# Altium footprint library Miscellaneous Devices LC.PcbLib: 776 footprints (part 14 of 49)
Each footprint in its own frame and in the unit in brackets; x right, y up, seen from the top. Pads: shape width x height; smd on the part's side, far side on the other; paste and mask are expansions set on the pad; w line width, h text height; cw(c..) or ccw(c..) is an arc to the next point about the centre after c.
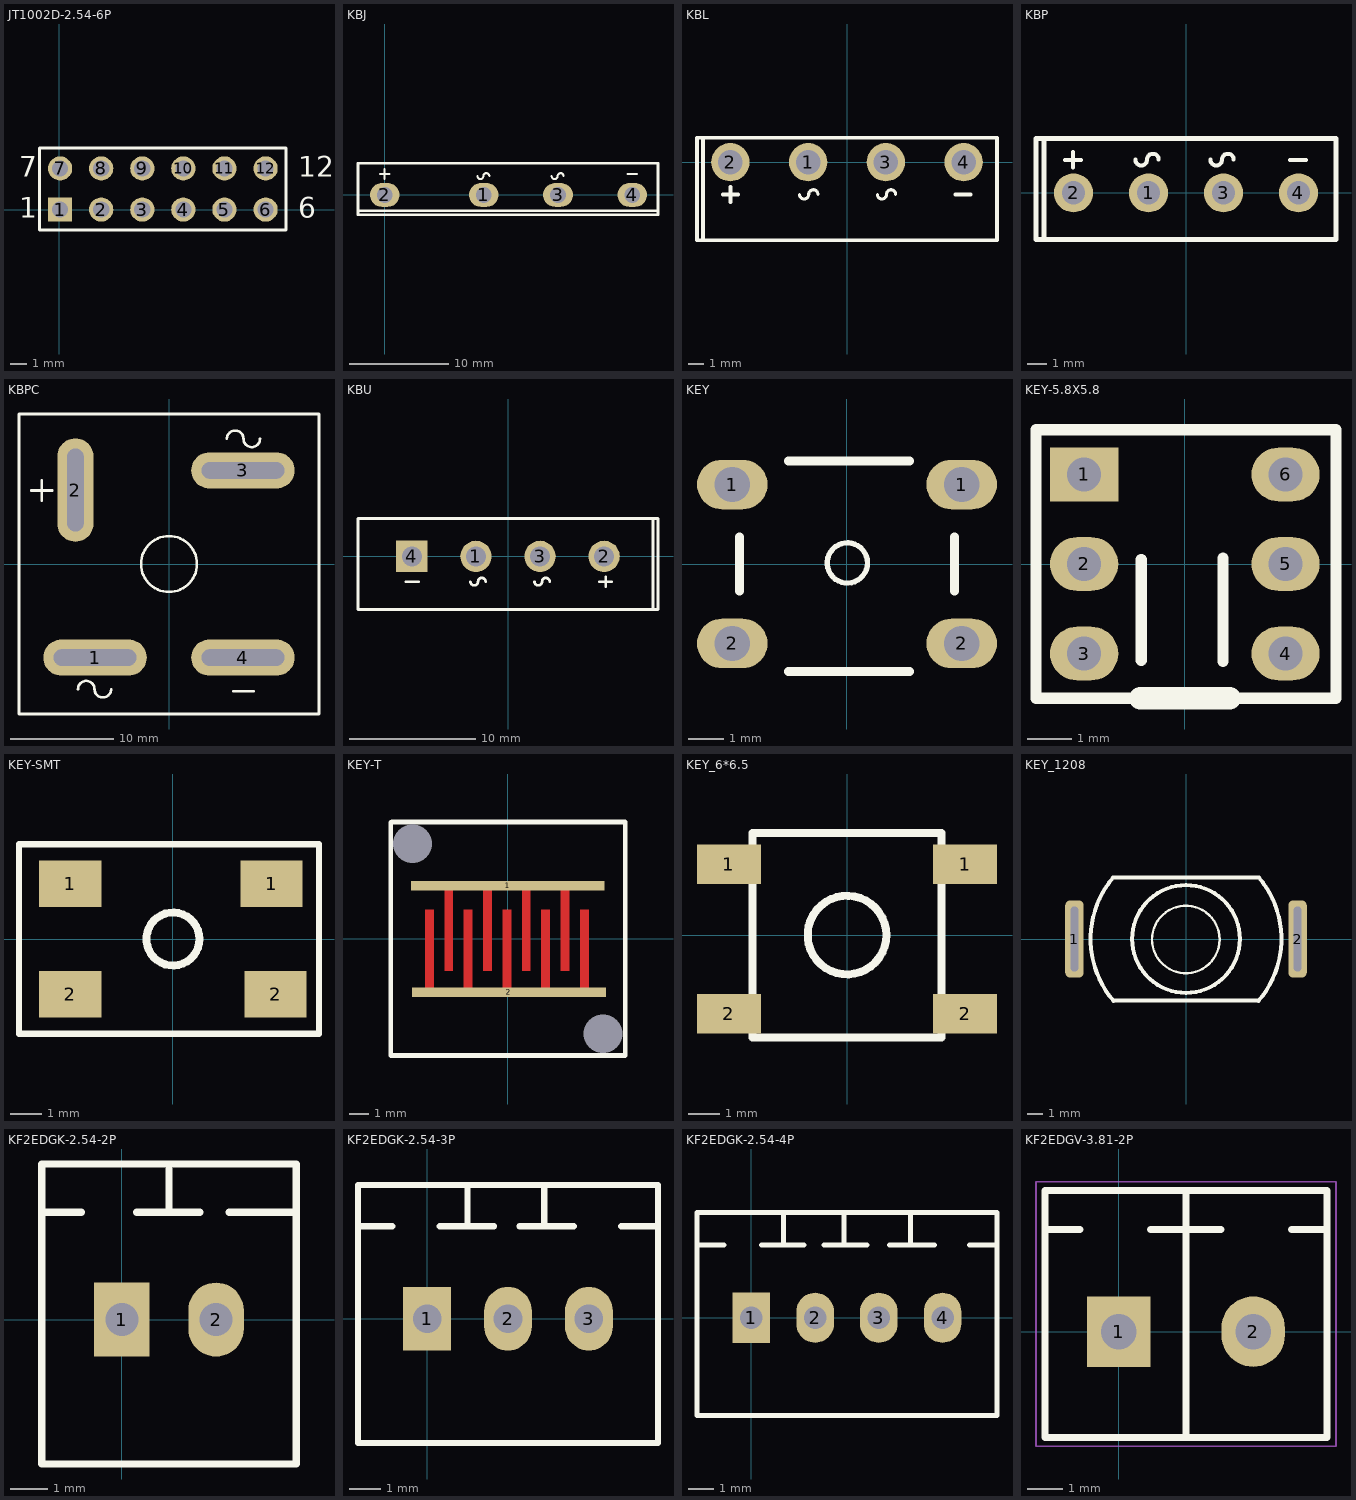
[diagram p13: the footprints below, top view; thin cyan lines are the x and y axes]

## JT1002D-2.54-6P [mm]
pads (12):
  rect 1.5x1.5 hole 1: 1(0.04,0)
  round 1.5 hole 1: 2(2.58,0) 3(5.12,0) 4(7.66,0) 5(10.2,0) 6(12.74,0) 7(0.04,2.54) 8(2.58,2.54) 9(5.12,2.54) 10(7.66,2.54) 11(10.2,2.54) 12(12.74,2.54)
Top Overlay:
  lines w0.2: -1.23,-1.27 14.01,-1.27 14.01,3.81 -1.23,3.81 -1.23,-1.27
  text "12" at 14.772,2.032 h1.27
  text "6" at 14.772,-0.508 h1.27
  text "1" at -2.5,-0.508 h1.27
  text "7" at -2.5,2.032 h1.27

## KBJ [mm]
pads (4):
  oval 3x2.4 hole 1.6: 1(10,0) 2(0,0) 3(17.5,0) 4(25,0)
Top Overlay:
  lines w0.203: -0.5,2.1 0.5,2.1 ; 0,1.6 0,2.6 ; 9.36,1.9 ccw(c9.66,1.9) 9.96,1.9 cw(c10.26,1.9) 10.56,1.9 ; 16.86,1.9 ccw(c17.16,1.9) 17.46,1.9 cw(c17.76,1.9) 18.06,1.9 ; 24.5,2.1 25.5,2.1
  lines w0.254: -2.7,-1.6 27.6,-1.6 ; -2.7,-2 27.6,-2 27.6,3.2 -2.7,3.2 -2.7,-2

## KBL [mm]
pads (4):
  round 2.5 hole 1.6: 1(-2.54,0) 2(-7.62,0) 3(2.54,0) 4(7.62,0)
Top Overlay:
  lines w0.203: -3.1,-2.1 ccw(c-2.8,-2.1) -2.5,-2.1 cw(c-2.2,-2.1) -1.9,-2.1 ; 1.98,-2.1 ccw(c2.28,-2.1) 2.58,-2.1 cw(c2.88,-2.1) 3.18,-2.1
  lines w0.254: -9.4,-5.1 -9.4,1.5 ; -8.12,-2.1 -7.12,-2.1 ; -7.62,-2.6 -7.62,-1.6 ; 7.08,-2.1 8.08,-2.1 ; -9.8,-5.1 9.8,-5.1 9.8,1.6 -9.8,1.6 -9.8,-5.1

## KBP [mm]
pads (4):
  round 2 hole 1.2: 1(-1.925,0) 2(-5.775,0) 3(1.925,0) 4(5.775,0)
Top Overlay:
  lines w0.203: -6.2,1.7 -5.4,1.7 ; -5.8,1.3 -5.8,2.1 ; -2.6,1.708 ccw(c-2.3,1.708) -2,1.708 cw(c-1.7,1.708) -1.4,1.708 ; 1.25,1.708 ccw(c1.55,1.708) 1.85,1.708 cw(c2.15,1.708) 2.45,1.708 ; 5.35,1.7 6.15,1.7
  lines w0.254: -7.3,-2.4 -7.3,2.8 ; -7.7,-2.4 7.7,-2.4 7.7,2.8 -7.7,2.8 -7.7,-2.4

## KBPC [mm]
pads (4):
  oval 10x3.5 hole 1.6 slot 8 at 0 deg: 1(-7.15,-9.05) 3(7.15,9.05) 4(7.15,-9.05)
  oval 3.5x10 hole 1.6 slot 8 at 90 deg: 2(-9.05,7.15)
Top Overlay:
  circle w0.254: c0,0 r2.7
  lines w0.254: -13.3,7.1 -11.3,7.1 ; -12.3,6.1 -12.3,8.1 ; -8.8,-12.1 cw(c-8,-12.1) -7.2,-12.1 ccw(c-6.4,-12.1) -5.6,-12.1 ; 5.6,12.1 cw(c6.4,12.1) 7.2,12.1 ccw(c8,12.1) 8.8,12.1 ; 6.2,-12.3 8.2,-12.3 ; -14.5,-14.5 -14.5,14.5 14.5,14.5 14.5,-14.5 -14.5,-14.5

## KBU [mm]
pads (4):
  round 2.5 hole 1.6: 1(-2.54,0) 2(7.62,0) 3(2.54,0)
  rect 2.5x2.5 hole 1.6: 4(-7.62,0)
Top Overlay:
  lines w0.203: -8.1,-2 -7.1,-2 ; -2.98,-2 ccw(c-2.68,-2) -2.38,-2 cw(c-2.08,-2) -1.78,-2 ; 2.1,-2 ccw(c2.4,-2) 2.7,-2 cw(c3,-2) 3.3,-2 ; 7.24,-2 8.24,-2 ; 7.74,-2.4 7.74,-1.6
  lines w0.254: 11.5,-4.2 11.5,3 ; -11.9,-4.2 11.9,-4.2 11.9,3 -11.9,3 -11.9,-4.2

## KEY [mm]
height 10
pads (4):
  oval 2x1.4 hole 1: 1(-3.25,2.25) 1(3.25,2.25) 2(-3.25,-2.25) 2(3.25,-2.25)
Top Overlay:
  circle w0.15: c0.01,0.03 r0.57
  lines w0.254: -3.048,-0.762 -3.048,0.762 ; -1.651,2.921 1.778,2.921 ; 3.048,-0.762 3.048,0.762 ; -1.651,-3.048 0.635,-3.048 1.778,-3.048 -1.651,-3.048

## KEY-5.8X5.8 [mm] "按键开关带自锁"
height 10
pads (6):
  rect 1.524x1.2 hole 0.762: 1(-2.25,2)
  oval 1.524x1.2 hole 0.762: 2(-2.25,0) 3(-2.25,-2) 4(2.25,-2) 5(2.25,0) 6(2.25,2)
Top Overlay:
  lines w0.254: -0.975,-2.15 -0.975,0.1 ; 0.85,-2.175 0.85,0.125 ; -3.325,-3 3.375,-3 3.375,3 -3.325,3 -3.325,-3
  lines w0.5: -1,-3 1,-3

## KEY-SMT [mm]
pads (4):
  rect 2x1.5 smd: 1(-3.302,1.778) 1(3.175,1.778) 2(-3.302,-1.778) 2(3.302,-1.778)
Top Overlay:
  circle w0.254: c0,0 r0.852
  lines w0.2: -4.953,-3.048 -4.953,3.048 4.699,3.048 4.699,-3.048 -4.953,-3.048
3D body "switch-tact-smt.STEP": height 1.5, standoff 0, extent -3.2,-2.667 3.2,2.633

## KEY-T [mm]
pads (4):
  rect 10x0.5 smd: 1(0.003,2.73) 2(0.063,-2.754)
  round 0 hole 2 unplated: " "(-4.912,4.9) " "(4.913,-4.9)
Top Layer:
  rectangle: 3.727,-2.959 4.184,1.511
  rectangle: 2.727,-1.664 3.184,2.807
  rectangle: 1.727,-2.959 2.184,1.511
  rectangle: 0.727,-1.664 1.184,2.807
  rectangle: -0.273,-2.959 0.184,1.511
  rectangle: -1.273,-1.664 -0.816,2.807
  rectangle: -2.273,-2.959 -1.816,1.511
  rectangle: -3.273,-1.664 -2.816,2.807
  rectangle: -4.273,-2.959 -3.816,1.511
Top Overlay:
  lines w0.25: -6.042,6.013 -6.042,-6.031 6.066,-6.031 6.066,5.981 ; -5.967,6.032 6.066,6.032

## KEY_6*6.5 [mm]
pads (4):
  rect 2.032x1.27 smd: 1(-3.75,2.25) 1(3.75,2.25) 2(-3.75,-2.5) 2(3.75,-2.5)
Top Overlay:
  circle w0.254: c0,0 r1.25
  lines w0.254: 0,-3.25 3,-3.25 3,3.25 -3,3.25 -3,-3.25 0.25,-3.25

## KEY_1208 [mm]
height 3
pads (2):
  rrect50% 1.2x5 hole 0.5 slot 4.2 at 90 deg: 1(-7.25,0) 2(7.25,0)
Top Overlay:
  circle w0.15: c-0.01,-0.03 r2.194
  circle w0.254: c0,0 r3.501
  lines w0.254: -4.742,3.994 ccw(c0,0) -4.722,-4.018 ; -4.7,-4 4.7,-4 ; -4.7,4 4.7,4 ; 4.722,-4.018 ccw(c0,0) 4.742,3.994

## KF2EDGK-2.54-2P [mm]
pads (2):
  rect 1.5x2 hole 0.9: 1(0,0)
  oval 1.5x2 hole 0.9: 2(2.54,0)
Top Overlay:
  lines w0.2: -2.17,2.9 -1.1,2.9 ; 0.4,2.9 2.1,2.9 ; 1.27,2.964 1.27,4.064 ; 2.9,2.9 4.6,2.9 ; -2.17,-3.9 -2.17,4.2 4.71,4.2 4.71,-3.9 -2.17,-3.9
Mechanical 15:
  lines w0.1: -2.17,-3.9 -2.17,4.2

## KF2EDGK-2.54-3P [mm]
pads (3):
  rect 1.5x2 hole 0.9: 1(0,0)
  oval 1.5x2 hole 0.9: 2(2.54,0) 3(5.08,0)
Top Overlay:
  lines w0.2: -2.17,2.9 -1.1,2.9 ; 0.4,2.9 2.1,2.9 ; 1.27,2.964 1.27,4.064 ; 2.9,2.9 4.6,2.9 ; 3.683,2.964 3.683,4.064 ; 6.1,2.9 7.19,2.9 ; -2.17,-3.9 -2.17,4.2 7.25,4.2 7.25,-3.9 -2.17,-3.9
Mechanical 15:
  lines w0.1: -2.17,-3.9 -2.17,4.2

## KF2EDGK-2.54-4P [mm]
pads (4):
  rect 1.5x2 hole 0.9: 1(0,0)
  oval 1.5x2 hole 0.9: 2(2.54,0) 3(5.08,0) 4(7.62,0)
Top Overlay:
  lines w0.2: -2.17,2.9 -1.1,2.9 ; 0.4,2.9 2.1,2.9 ; 1.27,2.964 1.27,4.064 ; 2.9,2.9 4.6,2.9 ; 3.683,2.964 3.683,4.064 ; 5.5,2.9 7.3,2.9 ; 6.35,2.964 6.35,4.064 ; 8.7,2.9 9.79,2.9 ; -2.17,-3.9 9.79,-3.9 9.79,4.2 -2.17,4.2 -2.17,-3.9
Mechanical 15:
  lines w0.1: -2.17,-3.9 -2.17,4.2

## KF2EDGV-3.81-2P [mm]
pads (2):
  rect 1.8x2 hole 1: 1(0,0)
  oval 1.8x2 hole 1: 2(3.81,0)
Top Overlay:
  lines w0.2: -2.095,2.9 -1.095,2.9 ; 0.9,2.9 2.9,2.9 ; 1.905,-3 1.905,4 ; 4.9,2.9 5.9,2.9 ; -2.095,-3 -2.095,4 5.905,4 5.905,-3 -2.095,-3
Mechanical 15:
  lines w0.1: -2.095,-3 5.905,-3 5.905,4 -2.095,4 -2.095,-3
Mechanical 20:
  lines w0.05: -2.345,-3.25 6.155,-3.25 6.155,4.25 -2.345,4.25 -2.345,-3.25